# Altium schematic symbol library SCHLIB.SchLib: 2608 symbols (part 5 of 20) (continued)
## IC-AR0231AT
designator U?, comment AR0231AT
Image Sensor CMOS 1/2.7Inch 2.3MP 1928x1208Pixel 121-Pin IBGA Tray; Manufacturer Part Number: AR0231AT7B00XUEA0-DRBR; Manufacturer: ON Semiconductor; Supplier 1: Digi-Key; RoHS: No; Category: Optoelectronics; Pricing 1: 2700=31.06250 (USD); Supplier Part Number 1: AR0231AT7B00XUEA0-DRBR-ND
part A pins: A6 DATA0_P (out), A7 DATA1_N (out), A8 CLK_P (out), A9 DATA2_P (out), A10 DATA3_N (out), B2 DOUT0 (out), B3 DOUT1 (out), B4 EXTCLK (in), B6 DATA0_N (out), B7 DATA1_P (out), B8 CLK_N (out), B9 DATA2_N (out), B10 DATA3_P (out), C3 DOUT3 (out), C4 DOUT2 (out), C5 RESET_BAR# (in), D2 DOUT4 (out), D3 DOUT5 (out), E2 DOUT6 (out), E3 DOUT7 (out), F2 PIXCLK (out), F3 DOUT8 (out), G2 DOUT9 (out), G3 FRAME_VALID (out), G4 LINE_VALID (out), G8 ATEST1 (io), G9 ATEST2 (io), G10 ATEST3 (io), G11 ATEST4 (io), H2 DOUT11 (out), H3 DOUT10 (out), H8 SCLK (in), H9 SDATA (io), H10 TEMP_FLAG (out), J2 DOUT13 (out), J3 DOUT12 (out), J8 GPIO1 (io), J9 GPIO0 (io), J10 SYS_CHECK (out), K2 TEST (in), K7 SADDR2 (in), K8 SADDR1 (in), K9 SADDR0 (in), K10 GPIO3 (io), K11 GPIO2 (io)
part B pins: A2 DGND30 (power), B5 DGND3 (power), C2 AGND0 (power), C8 DGND28 (power), C10 DGND39 (power), D4 DGND21 (power), D5 DGND13 (power), D6 DGND5 (power), D7 DGND7 (power), D8 DGND38 (power), D9 AGND1 (power), E1 DGND0 (power), E4 DGND31 (power), E5 DGND23 (power), E6 DGND15 (power), E7 DGND17 (power), E8 DGND9 (power), E9 AGND2 (power), F4 DGND2 (power), F5 DGND33 (power), F6 DGND25 (power), F7 DGND27 (power), F8 DGND19 (power), F9 AGND3 (power), F11 AGND4 (power), G1 DGND10 (power), G5 DGND4 (power), G6 DGND35 (power), G7 DGND37 (power), H4 DGND12 (power), H5 DGND14 (power), H6 DGND6 (power), H7 DGND8 (power), J1 DGND20 (power), J4 DGND22 (power), J5 DGND24 (power), J6 DGND16 (power), J7 DGND18 (power), K3 DGND1 (power), K4 DGND32 (power), K5 DGND34 (power), K6 DGND26 (power), L3 DGND11 (power), L6 DGND36 (power), L9 DGND29 (power)
part C pins: A1 VDD_IO0 (power), A3 VDD1 (power), A4 VDD4 (power), A5 VDD_IO3 (power), A11 VDD_IO7 (power), B1 VDD0 (power), B11 VDD5 (power), C1 VAA0 (power), C6 VDD_SLVS (power), C7 VDD_PHY (power), C9 VDD_IO_PHY (power), C11 VPP (power), D1 VDD_IO2 (power), D10 VAA1 (power), D11 VAA_PIX (power), E10 VAA2 (power), E11 VAA4 (power), F1 VDD3 (power), F10 VAA3 (power), H1 VDD_IO4 (power), H11 VDD_IO8 (power), J11 VDD8 (power), K1 VDD6 (power), L1 VDD_IO6 (power), L2 VDD9 (power), L4 VDD_IO1 (power), L5 VDD7 (power), L7 VDD_IO5 (power), L8 VDD10 (power), L10 VDD2 (power), L11 VDD_IO9 (power)

## IC-AT24C128C-SSHM-B
designator U?, comment AT24C128C  Case/Package: SOIC8
IC EEPROM 128K I2C 1MHZ 8SOIC; Manufacturer: Microchip / Atmel; Manufacturer Part Number: AT24C128C-SSHM-B; Access Time: 900ns; Density: 128Kb; Interface: 2-Wire,I2C,Serial; Max Supply Voltage: 5.5V; Min Supply Voltage: 1.7V; Nominal Supply Current: 3mA; Number of Words: 16384; Washability: OK; Supplier 1: Digi-Key; Stock 1: 1826; Pricing 1: 1=0.45, 10=0.443, 25=0.4116, 100=0.3636 (USD); Mount: Surface Mount; Number of Pins: 8; Contact Plating: Matte,Tin; Min Operating Temperature: -40°C; Max Operating Temperature: 85°C; Max Frequency: 1MHz; Frequency: 1MHz; Packaging: Bulk; Package Quantity: 100; Memory Type: EEPROM; Memory Size: 128Kb; Length: 5.05mm; Height: 1.5mm; Width: 3.99mm; Radiation Hardening: No; REACH SVHC: No SVHC; ComponentLink1URL: https://www.verical.com/server-webapp/html/getDatasheet?partID=319282; ComponentLink1Description: https://www.verical.com/server-webapp/html/getDatasheet?partID=319282; ComponentLink2URL: http://www.microchip.com/mymicrochip/filehandler.aspx?ddocname=en589922; ComponentLink2Description: http://www.microchip.com/mymicrochip/filehandler.aspx?ddocname=en589922; ComponentLink3URL: http://www.farnell.com/datasheets/1726559.pdf; ComponentLink3Description: http://www.farnell.com/datasheets/1726559.pdf; Supplier Part Number 1: AT24C128C-SSHM-B-ND
footprint SOIC8
pins: 1 A0 (in), 2 A1 (in), 3 A2 (in), 4 GND (power), 5 SDA (io), 6 SCL (io), 7 WP, 8 VCC (power)

## IC-AZ1117
designator U?, comment AZ1117  (value not drawn)
IC REG LDO POSITIVE ADJ 0.8A SOT223; Manufacturer: Diodes; Manufacturer Part Number: AZ1117IH-3.3TRG1; Alternate PN: TLV1117IDCYR; Output Voltage: 3.3V; Output Current: 800mA; Dropout Voltage: 1.2V; Number of Regulators: 1; Min Current Limit: 1A; Washability: OK; RoHS: Yes; Mount: Surface Mount; Case/Package: TO-261-4; Number of Pins: 3; Min Operating Temperature: -40°C; Max Operating Temperature: 125°C; Packaging: Tape and Reel; ComponentLink1URL: https://www.diodes.com/assets/Datasheets/AZ1117I.pdf?src-supplier=Digi-Key; ComponentLink1Description: https://www.diodes.com/assets/Datasheets/AZ1117I.pdf?src-supplier=Digi-Key; Supplier 1: Digi-Key; Stock 1: 4737; Pricing 1: 1=0.62000, 10=0.54400, 100=0.41690, 500=0.32960, 1000=0.26368 (USD); Supplier Part Number 1: AZ1117IH-ADJTRG1DICT-ND
footprint SOT223 (SOT,2.30mm pitch;4 pin,3.50mm W X 6.50mm L X 1.70mm H body)
pins: 1 ADJ/GND (in), 2 VOUT (power), 3 VIN (power), 4 VOUT (power)
1 alternate drawing of the same symbol
text: POSITIVE; LDO

## IC-AZ1117CH-3.3TRG1
designator U?, comment AZ1117
IC REG LINEAR 3.3V 800MA SOT223; Manufacturer: Diodes; Manufacturer Part Number: AZ1117CH-3.3TRG1; Number of Regulators: 1; Dropout Voltage: 1.2V; Output Type: Fixed; Max Input Voltage: 15V; Accuracy: 1%; Min Current Limit: 1A; Quiescent Current: 6mA; Power Supply Rejection Ratio (PSRR): 70dB; Polarity: Positive; Max Output Current: 1.35A; Reference Voltage: 1.262V; Supplier 1: Digi-Key; Supplier Part Number 1: AZ1117CH-3.3TRG1DICT-ND; Stock: 32181; Pricing: 1=0.43, 10=0.322, 25=0.2816, 100=0.1608, 250=0.1508, 500=0.1206, 1000=0.0925 (USD); RoHS: Yes; Mount: Surface Mount; Case/Package: SOT-223; Number of Pins: 4; Min Operating Temperature: -20°C; Max Operating Temperature: 125°C; Output Current: 800mA; Packaging: Tape and Reel; Output Voltage: 3.3V; Number of Outputs: 1; Package Quantity: 4000; Length: 6.7mm; Height: 1.7mm; Width: 3.7mm; Lead Free: Lead Free; ComponentLink1URL: https://datasheet.ciiva.com/29569/az1117c-29569913.pdf?src-supplier=Digi-Key; ComponentLink1Description: https://datasheet.ciiva.com/29569/az1117c-29569913.pdf?src-supplier=Digi-Key; ComponentLink2URL: https://datasheet.ciiva.com/29569/az1117c-29569915.pdf?src-supplier=Digi-Key; ComponentLink2Description: https://datasheet.ciiva.com/29569/az1117c-29569915.pdf?src-supplier=Digi-Key; ComponentLink3URL: https://datasheet.ciiva.com/29569/az1117c-29569914.pdf?src-supplier=Digi-Key; ComponentLink3Description: https://datasheet.ciiva.com/29569/az1117c-29569914.pdf?src-supplier=Digi-Key
footprint SOT223 (SOT,2.30mm pitch;4 pin,3.50mm W X 6.50mm L X 1.70mm H body)
pins: 1 GND (in), 2 VOUT (power), 3 VIN (power), 4 VOUT (power)
text: LDO

## IC-BC846S
designator U?, comment Case/Package: 6TSSOP  (hidden comment: BC846S)
TRANS 2NPN 40V 0.1A 6TSSOP; Manufacturer: NXP Semiconductors; Max Power Dissipation: 200mW; Max Collector Current: 100mA; Collector Base Voltage (VCBO): 50V; Frequency: 100MHz; Polarity: NPN; Emitter Base Voltage (VEBO): 5V; Number of Elements: 2; Test Current: 5mA; Zener Voltage: 5.1V; Element Configuration: Dual; Current: 1A; Washability: OK; Supplier 1: Digi-Key; Stock 1: 0; RoHS: Yes; Mount: Surface Mount; Number of Pins: 6; Min Operating Temperature: -65°C; Max Operating Temperature: 150°C; Collector Emitter Voltage (VCEO): 40V; Package Quantity: 1; Packaging: Tape and Reel; Transition Frequency: 100MHz; Collector Emitter Breakdown Voltage: 40V; Max Breakdown Voltage: 40V; Power Dissipation: 200mW; Termination: SMD/SMT; Gain Bandwidth Product: 100MHz; Voltage: 40V; Radiation Hardening: No; REACH SVHC: No SVHC; Lead Free: Lead Free; ComponentLink1URL: https://datasheet.ciiva.com/4722/pumz1-104831-4722227.pdf?src-supplier=Mouser; ComponentLink1Description: https://datasheet.ciiva.com/4722/pumz1-104831-4722227.pdf?src-supplier=Mouser; ComponentLink2URL: https://datasheet.ciiva.com/6366/pumz1-6366963.pdf?src-supplier=Digi-Key; ComponentLink2Description: https://datasheet.ciiva.com/6366/pumz1-6366963.pdf?src-supplier=Digi-Key; ComponentLink3URL: https://datasheet.ciiva.com/968/pumz1-968100.pdf?src-supplier=Digi-Key; ComponentLink3Description: https://datasheet.ciiva.com/968/pumz1-968100.pdf?src-supplier=Digi-Key; ComponentLink4URL: https://datasheet.ciiva.com/6366/pumz1-6366965.pdf?src-supplier=Digi-Key; ComponentLink4Description: https://datasheet.ciiva.com/6366/pumz1-6366965.pdf?src-supplier=Digi-Key; ComponentLink5URL: https://datasheet.ciiva.com/1259/pimz2-pumz2-1259478.pdf?src-supplier=Newark; ComponentLink5Description: https://datasheet.ciiva.com/1259/pimz2-pumz2-1259478.pdf?src-supplier=Newark; ComponentLink6URL: https://datasheet.ciiva.com/11201/pumz1-11201527.pdf?src-supplier=Avnet; ComponentLink6Description: https://datasheet.ciiva.com/11201/pumz1-11201527.pdf?src-supplier=Avnet; ComponentLink7URL: https://datasheet.ciiva.com/16615/pumz1-16615180.pdf?src-supplier=Avnet+Europe; ComponentLink7Description: https://datasheet.ciiva.com/16615/pumz1-16615180.pdf?src-supplier=Avnet+Europe; Supplier Part Number 1: 568-6556-1-ND; Manufacturer Part Number: BC846S
footprint SOT-363
pins: 1, 2, 3, 4, 5, 6

## IC-BH76361FV-E2
designator U?, comment BH76361FV-E2
IC AMP MPLEX AMP 16SSOP; Manufacturer 1: Rohm; Number of Channels: 1; Nominal Supply Current: 10mA; Washability: OK; Supplier 1: Digi-Key; Manufacturer Part Number 1: BH76361FV-E2; Stock 1: 1651; Pricing 1: 1=3,22000, 10=2,89300, 25=2,73480, 100=2,37000, 250=2,24848, 500=2,01756, 1000=1,70156 (USD); RoHS: Yes; Mount: Surface Mount; Case/Package: LSSOP; Number of Pins: 16; Contact Plating: Copper,Tin; Min Operating Temperature: -40°C; Max Operating Temperature: 85°C; Packaging: Tape and Reel; Package Quantity: 2500; Number of Circuits: 1; Operating Supply Current: 10mA; Radiation Hardening: No; Lead Free: Lead Free; ComponentLink1URL: https://datasheet.ciiva.com/15120/getdatasheetpartid-457541-15120107.pdf?src-supplier=Verical; ComponentLink1Description: https://datasheet.ciiva.com/15120/getdatasheetpartid-457541-15120107.pdf?src-supplier=Verical; ComponentLink2URL: https://datasheet.ciiva.com/1823/bh76330fvm-e-1823882.pdf?src-supplier=Digi-Key; ComponentLink2Description: https://datasheet.ciiva.com/1823/bh76330fvm-e-1823882.pdf?src-supplier=Digi-Key; ComponentLink3URL: https://datasheet.ciiva.com/1823/bh76330fvm-e-1823883.pdf?src-supplier=Digi-Key; ComponentLink3Description: https://datasheet.ciiva.com/1823/bh76330fvm-e-1823883.pdf?src-supplier=Digi-Key; ComponentLink4URL: https://datasheet.ciiva.com/25921/bh76330fvm-e-25921499.pdf?src-supplier=Avnet+Europe; ComponentLink4Description: https://datasheet.ciiva.com/25921/bh76330fvm-e-25921499.pdf?src-supplier=Avnet+Europe; ComponentLink5URL: https://datasheet.ciiva.com/1823/bh76330fvm-e-1823884.pdf?src-supplier=Digi-Key; ComponentLink5Description: https://datasheet.ciiva.com/1823/bh76330fvm-e-1823884.pdf?src-supplier=Digi-Key; Supplier Part Number 1: BH76361FV-E2CT-ND
footprint SSOP16
pins: 1 PVCC (power), 2 IN1 (in), 3 VCC (power), 4 IN2 (in), 5 GND (power), 6 IN3 (in), 7 GND (power), 8 IN4 (in), 9 IN5 (in), 10 CTLA (in), 11 IN6 (in), 12 CTLB (in), 13 CTLC (in), 14 CTLD (in), 15 PGND (power), 16 OUT (out)
text: 6dB; 75R; L / O / G / I / C

## IC-BTS462-T
designator U?, comment BTS462-T
IC PWR SWITCH N-CHAN 1:1 TO252-5; Manufacturer: Infineon; Output Current: 3.5A; Number of Outputs: 1; Nominal Supply Current: 1.3mA; Max Supply Voltage: 34V; Max Power Dissipation: 41.6W; Min Input Voltage: 5V; On-State Resistance: 70mR; Output Current per Channel: 4.4A; Turn-On Delay Time: 170us; Turn-Off Delay Time: 230us; Voltage: 16V; Max Output Current: 14A; Supplier 1: Digi-Key; Supplier Part Number 1: BTS462TATMA1CT-ND; Manufacturer Part Number: BTS462-T; Stock: 6462; Pricing: 1=1.98, 10=1.776, 25=1.6756, 100=1.3406, 250=1.173, 500=1.1395, 1000=0.9049 (USD); RoHS: Yes; Case/Package: TO-252-5; Number of Pins: 5; Min Operating Temperature: -40°C; Max Operating Temperature: 150°C; Number of Channels: 1; Packaging: Tape and Reel; Power Dissipation: 41.6W; Package Quantity: 2500; Max Input Voltage: 34V; Min Supply Voltage: 5V; Max Supply Current: 1.3mA; Current: 4.4A; Operating Supply Voltage: 34V; Length: 6.5mm; Height: 2.3mm; Width: 6.22mm; Radiation Hardening: No; Halogen Free: Halogen Free; Lead Free: Contains Lead; REACH SVHC: No SVHC; ComponentLink1URL: https://datasheet.ciiva.com/15109/getdatasheetpartid-413054-15109087.pdf?src-supplier=Verical; ComponentLink1Description: https://datasheet.ciiva.com/15109/getdatasheetpartid-413054-15109087.pdf?src-supplier=Verical; ComponentLink2URL: https://datasheet.ciiva.com/1957/infineon-bts462t-ds-v01-01-en-1957175.pdf?src-supplier=Digi-Key; ComponentLink2Description: https://datasheet.ciiva.com/1957/infineon-bts462t-ds-v01-01-en-1957175.pdf?src-supplier=Digi-Key; ComponentLink3URL: https://datasheet.ciiva.com/1957/infineon-bts462t-ds-v01-01-en-1957176.pdf?src-supplier=Digi-Key; ComponentLink3Description: https://datasheet.ciiva.com/1957/infineon-bts462t-ds-v01-01-en-1957176.pdf?src-supplier=Digi-Key; ComponentLink4URL: https://datasheet.ciiva.com/1957/infineon-bts462t-ds-v01-01-en-1957177.pdf?src-supplier=Digi-Key; ComponentLink4Description: https://datasheet.ciiva.com/1957/infineon-bts462t-ds-v01-01-en-1957177.pdf?src-supplier=Digi-Key
footprint TO-252-5 (DPAK, 5-Leads, Body 6.5x6.12mm, Pitch 1.14mm, IPC Medium Density)
pins: 1 GND (power) "Logic ground.", 2 IN (in) "Input, activates the power switch in case of logical high signal.", 3 VBB (power) "Positive power supply voltage.", 4 NC "Not connected.", 5 OUT (power) "Output to the load."

## IC-BTS6143D
designator U?, comment BTS6143D
IC PWR SWITCH N-CHAN 1:1 TO252-5; Manufacturer: Infineon; Output Current: 8A; Number of Outputs: 1; Max Power Dissipation: 59W; Max Supply Voltage: 38V; Supplier 1: Digi-Key; Supplier Part Number 1: BTS6143DAUMA1CT-ND; Manufacturer Part Number: BTS6143D; Stock: 19929; Pricing: 1=2.56, 10=2.296, 25=2.1664, 100=1.7332, 250=1.5166, 500=1.4732, 1000=1.1699 (USD); RoHS: Yes; Mount: Surface Mount; Case/Package: TO-252; Min Operating Temperature: -40°C; Max Operating Temperature: 150°C; Packaging: Tape and Reel; Power Dissipation: 59W; Number of Channels: 1; Radiation Hardening: No; Lead Free: Contains Lead; Halogen Free: Halogen Free; ComponentLink1URL: https://datasheet.ciiva.com/26880/bts6143d-26880342.pdf?src-supplier=IIIC; ComponentLink1Description: https://datasheet.ciiva.com/26880/bts6143d-26880342.pdf?src-supplier=IIIC; ComponentLink2URL: https://datasheet.ciiva.com/1955/infineon-bts6143d-ds-v01-00-en-1955848.pdf?src-supplier=Digi-Key; ComponentLink2Description: https://datasheet.ciiva.com/1955/infineon-bts6143d-ds-v01-00-en-1955848.pdf?src-supplier=Digi-Key; ComponentLink3URL: https://datasheet.ciiva.com/1955/infineon-bts6143d-ds-v01-00-en-1955849.pdf?src-supplier=Digi-Key; ComponentLink3Description: https://datasheet.ciiva.com/1955/infineon-bts6143d-ds-v01-00-en-1955849.pdf?src-supplier=Digi-Key; ComponentLink4URL: https://datasheet.ciiva.com/1955/infineon-bts6143d-ds-v01-00-en-1955850.pdf?src-supplier=Digi-Key; ComponentLink4Description: https://datasheet.ciiva.com/1955/infineon-bts6143d-ds-v01-00-en-1955850.pdf?src-supplier=Digi-Key; ComponentLink5URL: https://datasheet.ciiva.com/26931/getdatasheetpartid-730772-26931260.pdf?src-supplier=Verical; ComponentLink5Description: https://datasheet.ciiva.com/26931/getdatasheetpartid-730772-26931260.pdf?src-supplier=Verical; ComponentLink6URL: https://datasheet.ciiva.com/41458/001183579-da-01-en-ic-switch-pwr-hisi-bts6143d-to-252-5-inf-41458534.pdf?src-supplier=Conrad; ComponentLink6Description: https://datasheet.ciiva.com/41458/001183579-da-01-en-ic-switch-pwr-hisi-bts6143d-to-252-5-inf-41458534.pdf?src-supplier=Conrad
footprint TO-252-5 (DPAK, 5-Leads, Body 6.5x6.12mm, Pitch 1.14mm, IPC Medium Density)
pins: 1 OUT_1 (power) "Output to the load.", 2 IN (in) "Input, activates the power switch in case of logical high signal.", 3 VBB (power) "Positive power supply voltage.", 4 IS "Not connected.", 5 OUT_2 (power) "Logic ground."

## IC-CAT24C128WI-GT3
designator U?, comment CAT24C128WI-GT3  Case/Package: SOIC8
IC EEPROM 128KBIT 400KHZ 8SOIC; Manufacturer: ON Semiconductor; Access Time: 900ns; Interface: 2-Wire,I2C,Serial; Density: 128Kb; Operating Supply Voltage: 5V; Max Supply Voltage: 5.5V; Min Supply Voltage: 1.8V; Nominal Supply Current: 3mA; Number of Words: 16000; Washability: OK; Supplier 1: Digi-Key; Manufacturer Part Number: CAT24C128WI-GT3; Stock 1: 2370; Pricing 1: 1=0.31, 10=0.309, 100=0.2532, 500=0.24616, 1000=0.23956 (USD); Mount: Surface Mount; Number of Pins: 8; Contact Plating: Gold; Min Operating Temperature: -40°C; Max Operating Temperature: 85°C; Packaging: Tape and Reel; Package Quantity: 1; Frequency: 400kHz; Memory Type: EEPROM; Memory Size: 128Kb; Max Frequency: 400kHz; Length: 0.196inch; Height: 1.5mm; Width: 0.157inch; Radiation Hardening: No; Lead Free: Lead Free; Halogen Free: Halogen Free; ComponentLink1URL: http://www.onsemi.com/pub_link/Collateral/CAT24C128-D.PDF; ComponentLink1Description: http://www.onsemi.com/pub_link/Collateral/CAT24C128-D.PDF; ComponentLink2URL: http://www.onsemi.com/pub/Collateral/CAT24C128-D.PDF; ComponentLink2Description: http://www.onsemi.com/pub/Collateral/CAT24C128-D.PDF; ComponentLink3URL: https://www.verical.com/server-webapp/html/getDatasheet?partID=316844; ComponentLink3Description: https://www.verical.com/server-webapp/html/getDatasheet?partID=316844; Supplier Part Number 1: CAT24C128WI-GT3DKR-ND
footprint SOIC8
pins: 1 A0 (in), 2 A1 (in), 3 A2 (in), 4 GND (power), 5 SDA (io), 6 SCL (io), 7 WP, 8 VCC (power)

## IC-CD22M3494MQZ
designator U?, comment CD22M3494MQZ
IC CROSSPOINT SWITCH 16X8 44PLCC; Manufacturer: Intersil; Min Supply Voltage: 4V; Max Supply Voltage: 15V; Operating Supply Voltage: 12V; On-State Resistance: 65R; Operating Supply Current: 5mA; Supply Type: Single; Washability: OK; Supplier 1: Digi-Key; Supplier Part Number 1: CD22M3494MQZ-ND; Manufacturer Part Number: CD22M3494MQZ; Stock: 1291; Pricing: 1=7.28, 10=6.579, 25=6.2732, 100=5.202, 250=4.743, 500=4.437, 1000=3.978, 2500=3.825, 5000=3.7638 (USD); RoHS: Yes; Mount: Surface Mount; Case/Package: PLCC; Number of Pins: 44; Min Operating Temperature: -40°C; Max Operating Temperature: 85°C; Package Quantity: 26; Packaging: Rail/Tube; REACH SVHC: No SVHC; Lead Free: Lead Free; ComponentLink1URL: https://datasheet.ciiva.com/16633/fn2793-16633684.pdf?src-supplier=Avnet+Europe; ComponentLink1Description: https://datasheet.ciiva.com/16633/fn2793-16633684.pdf?src-supplier=Avnet+Europe; ComponentLink2URL: https://datasheet.ciiva.com/26824/cd22m3494mqz-26824877.pdf?src-supplier=IIIC; ComponentLink2Description: https://datasheet.ciiva.com/26824/cd22m3494mqz-26824877.pdf?src-supplier=IIIC; ComponentLink3URL: https://datasheet.ciiva.com/1514/fn2793-1514669.pdf?src-supplier=Element14; ComponentLink3Description: https://datasheet.ciiva.com/1514/fn2793-1514669.pdf?src-supplier=Element14; ComponentLink4URL: https://datasheet.ciiva.com/6638/fn2793-6638251.pdf?src-supplier=Digi-Key; ComponentLink4Description: https://datasheet.ciiva.com/6638/fn2793-6638251.pdf?src-supplier=Digi-Key
footprint PLCC44 (Leaded Chip Carrier, 44-Leads, Body 16.6x16.6mm, Pitch 1.27mm, IPC Low Density)
pins: 1 Y3, 2 AY2, 3 RESET, 4 AX3, 5 AX0, 7 X14, 8 X15, 9 X6, 10 X7, 11 X8, 12 X9, 13 X10, 14 X11, 17 Y7, 18 VSS, 19 Y6, 20 STROBE, 21 Y5, 22 VEE, 23 Y4, 24 AX1, 25 AX2, 26 AY0, 27 AY1, 30 X13, 31 X12, 32 X5, 33 X4, 34 X3, 35 X2, 36 X1, 37 X0, 39 Y0, 40 CS, 41 Y1, 42 DATA, 43 Y2, 44 VDD

## IC-CD74HC238PWR
designator U?, comment CD74HC238PWR
IC DECODER/DEMUX HS 3-8 16-TSSOP; Manufacturer: Texas Instruments; Number of Inputs: 3; Number of Outputs: 8; Propagation Delay: 265ns; Max Supply Voltage: 6V; Min Supply Voltage: 2V; Logic Function: Demultiplexer,Decoder; Number of Elements: 1; Rise Time: 400ns; High Level Output Current: -5.2mA; Low Level Output Current: 5.2mA; Polarity: Non-Inverting; Quiescent Current: 8uA; Supply Type: Single; Bandwidth: 28MHz; Output Current: 25mA; Washability: OK; Supplier 1: Digi-Key; Supplier Part Number 1: 296-13814-1-ND; Manufacturer Part Number: CD74HC238PWR; Stock 1: 88860; Pricing 1: 1=0.49000, 10=0.42100, 25=0.39280, 100=0.31440, 250=0.29192, 500=0.24700, 1000=0.19086 (USD); RoHS: Yes; Mount: Surface Mount; Case/Package: TSSOP; Number of Pins: 16; Weight: 0.002183oz; Contact Plating: Gold; Min Operating Temperature: -55°C; Max Operating Temperature: 125°C; Packaging: Tape and Reel; Package Quantity: 2000; Number of Input Lines: 3; Number of Output Lines: 8; Turn-On Delay Time: 265ns; Termination: SMD/SMT; Number of Circuits: 1; Number of Bits: 8; Independent Circuits: 1; Number of Channels: 1; Max Frequency: 28MHz; Output Voltage: 6V; Max Supply Current: 8uA; Length: 5mm; Height: 1.15mm; Width: 4.4mm; Radiation Hardening: No; REACH SVHC: No SVHC; Lead Free: Lead Free; ComponentLink1URL: https://datasheet.ciiva.com/1888/cd74hc138-1888752.pdf?src-supplier=Digi-Key; ComponentLink1Description: https://datasheet.ciiva.com/1888/cd74hc138-1888752.pdf?src-supplier=Digi-Key; ComponentLink2URL: https://datasheet.ciiva.com/15092/getdatasheetpartid-310028-15092428.pdf?src-supplier=Verical; ComponentLink2Description: https://datasheet.ciiva.com/15092/getdatasheetpartid-310028-15092428.pdf?src-supplier=Verical; ComponentLink3URL: https://datasheet.ciiva.com/1888/cd74hc138-1888754.pdf?src-supplier=Digi-Key; ComponentLink3Description: https://datasheet.ciiva.com/1888/cd74hc138-1888754.pdf?src-supplier=Digi-Key; ComponentLink4URL: https://datasheet.ciiva.com/14293/cd54hc238-14293194.pdf?src-supplier=Avnet; ComponentLink4Description: https://datasheet.ciiva.com/14293/cd54hc238-14293194.pdf?src-supplier=Avnet; ComponentLink5URL: https://datasheet.ciiva.com/14294/cd54hc238-14294925.pdf?src-supplier=Avnet; ComponentLink5Description: https://datasheet.ciiva.com/14294/cd54hc238-14294925.pdf?src-supplier=Avnet; ComponentLink6URL: https://datasheet.ciiva.com/1888/cd74hc138-1888753.pdf?src-supplier=Digi-Key; ComponentLink6Description: https://datasheet.ciiva.com/1888/cd74hc138-1888753.pdf?src-supplier=Digi-Key; ComponentLink7URL: https://datasheet.ciiva.com/22645/1861095-22645579.pdf?src-supplier=Element14; ComponentLink7Description: https://datasheet.ciiva.com/22645/1861095-22645579.pdf?src-supplier=Element14; ComponentLink8URL: https://datasheet.ciiva.com/22654/1762451-22654207.pdf?src-supplier=Farnell; ComponentLink8Description: https://datasheet.ciiva.com/22654/1762451-22654207.pdf?src-supplier=Farnell
footprint TSSOP16
pins: 1 A0 (in), 2 A1 (in), 3 A2 (in), 4 ~{E1} (in), 5 ~{E2} (in), 6 E3 (in), 7 Y7 (out), 8 GND (power), 9 Y6 (out), 10 Y5 (out), 11 Y4 (out), 12 Y3 (out), 13 Y2 (out), 14 Y1 (out), 15 Y0 (out), 16 VCC (power)

## IC-CD4011BNSR
designator U?, comment CD4011BNSR  Case/Package: SOIC14
IC GATE NAND 4CH 2-INP 14-SO; Manufacturer: Texas Instruments; Number of Outputs: 1; Max Supply Voltage: 18V; Min Supply Voltage: 3V; Propagation Delay: 90ns; Number of Inputs: 2; Number of Circuits: 4; Quiescent Current: 1uA; High Level Output Current: 3.4mA; Turn-On Delay Time: 250ns; Output Current: 6.8mA; Washability: OK; Supplier 1: Digi-Key; Manufacturer Part Number: CD4011BNSR; Stock 1: 2973; Pricing 1: 1=0.46, 10=0.398, 100=0.2971, 500=0.2334, 1000=0.18035 (USD); Mount: Surface Mount; Number of Pins: 14; Weight: 0.007348oz; Contact Plating: Gold; Min Operating Temperature: -55°C; Max Operating Temperature: 125°C; Packaging: Tape and Reel; Package Quantity: 1; Logic Function: NAND; Low Level Output Current: 3.4mA; Number of Gates: 4; Number of Input Lines: 2; Number of Output Lines: 1; Number of Elements: 4; Number of Bits: 4; Lead Free: Lead Free; ComponentLink1URL: http://www.ti.com/lit/pdf/sdyu001; ComponentLink1Description: http://www.ti.com/lit/pdf/sdyu001; ComponentLink2URL: http://www.ti.com/general/docs/lit/getliterature.tsp?genericPartNumber=CD4011B-MIL&&fileType=pdf; ComponentLink2Description: http://www.ti.com/general/docs/lit/getliterature.tsp?genericPartNumber=CD4011B-MIL&&fileType=pdf; Supplier Part Number 1: 296-14085-6-ND
footprint SOIC14
pins: 1 1A, 2 1B, 3 1Y, 4 2Y, 5 2A, 6 2B, 7 GND, 8 3A, 9 3B, 10 3Y, 11 4Y, 12 4A, 13 4B, 14 VCC

## IC-CD4013BM96G4
designator U?, comment CD4013B
IC FF D-TYPE DUAL 1BIT 14SOIC; Manufacturer: Texas Instruments; Manufacturer Part Number: CD4013BM96G4; Polarity: Non-Inverting; Frequency: 24MHz; Logic Function: AND,D-Type; Max Supply Voltage: 18V; Min Supply Voltage: 3V; Number of Bits: 2; Propagation Delay: 300ns; Clock Edge Trigger Type: Positive Edge; Turn-On Delay Time: 45ns; High Level Output Current: -4.2mA; Low Level Output Current: 6.8mA; Number of Bits per Element: 1; Number of Outputs: 4; Quiescent Current: 20uA; Washability: OK; Supplier 1: Digi-Key; Supplier Part Number 1: 296-31487-1-ND; Stock: 8095; Pricing: 1=0.41, 10=0.353, 25=0.3292, 100=0.2632, 250=0.2444, 500=0.2068, 1000=0.1598 (USD); RoHS: Yes; Mount: Surface Mount; Case/Package: SOIC; Number of Pins: 14; Weight: 0.004564oz; Contact Plating: Gold; Min Operating Temperature: -55°C; Max Operating Temperature: 125°C; Packaging: Tape and Reel; Number of Elements: 2; Number of Circuits: 2; Package Quantity: 2500; Number of Input Lines: 1; Number of Output Lines: 1; Length: 8.65mm; Height: 1.58mm; Width: 3.91mm; Radiation Hardening: No; Lead Free: Lead Free; ComponentLink1URL: https://datasheet.ciiva.com/26054/cd4013b-mil-26054901.pdf?src-supplier=Avnet+Europe; ComponentLink1Description: https://datasheet.ciiva.com/26054/cd4013b-mil-26054901.pdf?src-supplier=Avnet+Europe
footprint SOIC14
pins: 1 Q1 (out), 2 Q1 (out), 3 CLOCK1 (in), 4 RESET1 (in), 5 D1 (in), 6 SET1 (in), 7 VSS (power), 8 SET2 (in), 9 D2 (in), 10 RESET2 (in), 11 CLOCK2 (in), 12 Q2 (out), 13 Q2 (out), 14 VDD (power)

## IC-CD4066BM96
designator U?, comment CD4066BM96  Case/Package: SOIC14
IC QUAD BILATERAL SWITCH 14-SOIC; Manufacturer: Texas Instruments; Number of Inputs: 4; Min Supply Voltage: 3V; Max Supply Voltage: 18V; Supply Type: Dual,Single; Min Dual Supply Voltage: 1.5V; Max Dual Supply Voltage: 9V; Bandwidth: 40MHz; Dual Supply Voltage: 7.5V; On-State Resistance: 240R; Turn-On Delay Time: 30ns; Max Supply Current: 5uA; Polarity: Non-Inverting; Throw Configuration: SPST; Quiescent Current: 20nA; Washability: OK; Supplier 1: Digi-Key; Manufacturer Part Number: CD4066BM96; Stock 1: 71359; Pricing 1: 1=0.42, 10=0.363, 100=0.2711, 500=0.213, 1000=0.16459 (USD); Mount: Surface Mount; Number of Pins: 14; Weight: 0.004318oz; Contact Plating: Gold; Min Operating Temperature: -55°C; Max Operating Temperature: 125°C; Number of Outputs: 4; Packaging: Tape and Reel; Package Quantity: 2500; Independent Circuits: 4; Number of Channels: 4; Turn-Off Delay Time: 30ns; Number of Bits: 4; Length: 8.65mm; Height: 1.58mm; Width: 3.91mm; Radiation Hardening: No; Lead Free: Lead Free; REACH SVHC: No SVHC; ComponentLink1URL: http://www.farnell.com/datasheets/1874823.pdf; ComponentLink1Description: http://www.farnell.com/datasheets/1874823.pdf; ComponentLink2URL: http://www.ti.com/lit/ds/symlink/cd4066b.pdf; ComponentLink2Description: http://www.ti.com/lit/ds/symlink/cd4066b.pdf; ComponentLink3URL: http://www.ti.com/general/docs/lit/getliterature.tsp?genericPartNumber=CD4066B-MIL&&fileType=pdf; ComponentLink3Description: http://www.ti.com/general/docs/lit/getliterature.tsp?genericPartNumber=CD4066B-MIL&&fileType=pdf; ComponentLink4URL: https://www.verical.com/server-webapp/html/getDatasheet?partID=50227; ComponentLink4Description: https://www.verical.com/server-webapp/html/getDatasheet?partID=50227; ComponentLink5URL: http://focus.ti.com/lit/ds/symlink/cd4066b.pdf; ComponentLink5Description: http://focus.ti.com/lit/ds/symlink/cd4066b.pdf; Supplier Part Number 1: 296-14475-6-ND
footprint SOIC14
pins: 1 SIGA-IN/OUT, 2 SIGA-OUT/IN, 3 SIGB-OUT/IN, 4 SIGB-IN/OUT, 5 CONTROLB, 6 CONTROLC, 7 GND, 8 SIGC-IN/OUT, 9 SIGC-OUT/IN, 10 SIGD-OUT/IN, 11 SIGD-/IN/OUT, 12 CONTROLD, 13 CONTROLA, 14 VCC

## IC-CD4067BM96G4
designator U?, comment CD4067BM96G4  Case/Package: SOIC24
IC MUX/DEMUX 1X16 24SOIC; Manufacturer: Texas Instruments; Bandwidth: 14MHz; Min Supply Voltage: 3V; Max Supply Voltage: 18V; On-State Resistance: 240R; Turn-On Delay Time: 650ns; Turn-Off Delay Time: 440ns; Supply Type: Single; Nominal Supply Current: 100uA; Propagation Delay: 60ns; Max Power Dissipation: 500mW; Number of Inputs: 16; Number of Outputs: 1; Operating Supply Current: 80nA; Logic Function: Multiplexer,Demultiplexer; Washability: OK; Supplier 1: Digi-Key; Manufacturer Part Number: CD4067BM96G4; Stock 1: 0; Pricing 1: 2000=0,52269 (USD); RoHS: Yes; Mount: Surface Mount; Number of Pins: 24; Weight: 0.02187oz; Contact Plating: Gold; Min Operating Temperature: -55°C; Max Operating Temperature: 125°C; Packaging: Tape and Reel; Package Quantity: 2000; Number of Channels: 1; Power Dissipation: 500mW; Number of Bits: 16; Lead Free: Lead Free; ComponentLink1URL: https://datasheet.ciiva.com/1682/cd4067b-1682287.pdf?src-supplier=Digi-Key; ComponentLink1Description: https://datasheet.ciiva.com/1682/cd4067b-1682287.pdf?src-supplier=Digi-Key; Supplier Part Number 1: CD4067BM96G4-ND
footprint SOIC24
pins: 1 OUT, 2 S7, 3 S6, 4 S5, 5 S4, 6 S3, 7 S2, 8 S1, 9 S0, 10 A, 11 B, 12 GND, 13 D, 14 C, 15 INH, 16 S15, 17 S14, 18 S13, 19 S12, 20 S11, 21 S10, 22 S9, 23 S8, 24 VCC

## IC-CPC1117NTR
designator U?, comment CPC1117NTR  Case/Package: SOP4
SSR RELAY SPST-NC 150MA 0-60V; Manufacturer: Ixys Clare; Output Voltage: 60V; Throw Configuration: SPST; On-State Resistance: 16R; Isolation Voltage: 1.5kV; Max Input Current: 50mA; Voltage Rating: 50V; Contact Resistance: 20mR; Max Voltage Rating (DC): 5.05kV; Current Rating: 1A; Number of Positions: 5; Gender: Male; Connector Type: Male Pin; Pitch: 1mm; Glow Wire Compliant: Non-compliant; Washability: OK; Supplier 1: Future Electronics; Manufacturer Part Number: CPC1117NTR; Stock 1: 93488; Pricing 1: 1=2,60000, 100=1,95000, 250=1,84000, 500=1,77000, 1000=1,69000 (USD); RoHS: Yes; Mount: Surface Mount; Number of Pins: 4; Min Operating Temperature: -40°C; Max Operating Temperature: 85°C; Packaging: Tape and Reel; Max Output Current: 150mA; Package Quantity: 2000; Output Current: 150mA; Termination: Gull Wing; Load Current: 150mA; Max Output Voltage: 60V; Input Current: 50mA; Relay Type: Relay; Length: 4.089mm; Height: 2.184mm; Width: 3.8mm; Radiation Hardening: No; ComponentLink1URL: https://datasheet.ciiva.com/16498/cpc1117ntr-16498380.pdf?src-supplier=Future+Electronics; ComponentLink1Description: https://datasheet.ciiva.com/16498/cpc1117ntr-16498380.pdf?src-supplier=Future+Electronics; ComponentLink2URL: https://datasheet.ciiva.com/2421/cpc1117n-2421253.pdf?src-supplier=Digi-Key; ComponentLink2Description: https://datasheet.ciiva.com/2421/cpc1117n-2421253.pdf?src-supplier=Digi-Key; ComponentLink3URL: https://datasheet.ciiva.com/2421/cpc1117n-2421254.pdf?src-supplier=Digi-Key; ComponentLink3Description: https://datasheet.ciiva.com/2421/cpc1117n-2421254.pdf?src-supplier=Digi-Key; ComponentLink4URL: https://datasheet.ciiva.com/2421/cpc1117n-2421255.pdf?src-supplier=Digi-Key; ComponentLink4Description: https://datasheet.ciiva.com/2421/cpc1117n-2421255.pdf?src-supplier=Digi-Key; ComponentLink5URL: https://datasheet.ciiva.com/39122/3cpc1117n-39122778.pdf?src-supplier=Onlinecomponents.com; ComponentLink5Description: https://datasheet.ciiva.com/39122/3cpc1117n-39122778.pdf?src-supplier=Onlinecomponents.com; Supplier Part Number 1: CPC1117NTR-CUTT; Color: Natural; Contact Plating: Tin; Contact Material: Bronze,Tin; Housing Color: Natural; Housing Material: Nylon; Number of Rows: 1; Voltage Rating (AC): 50V; Fastening Type: Detent; Number of Contacts: 5; Max Voltage Rating (AC): 50V; Contact Gender: Male; Orientation: Vertical; Number of Circuits: 5; Depth: 3.6mm; REACH SVHC: Unknown; Lead Free: Lead Free; ComponentLink6URL: https://datasheet.ciiva.com/11748/0900766b80b0af91-11748006.pdf?src-supplier=RSComponents; ComponentLink6Description: https://datasheet.ciiva.com/11748/0900766b80b0af91-11748006.pdf?src-supplier=RSComponents; ComponentLink7URL: https://datasheet.ciiva.com/30169/101445013310507-pcb-headers-30169975.pdf?src-supplier=Onlinecomponents.com; ComponentLink7Description: https://datasheet.ciiva.com/30169/101445013310507-pcb-headers-30169975.pdf?src-supplier=Onlinecomponents.com; ComponentLink8URL: https://datasheet.ciiva.com/9469/5013310507-pcb-headers-9469065.pdf?src-supplier=Avnet; ComponentLink8Description: https://datasheet.ciiva.com/9469/5013310507-pcb-headers-9469065.pdf?src-supplier=Avnet; ComponentLink9URL: https://datasheet.ciiva.com/5156/5013310507-pcb-headers-179252-5156221.pdf?src-supplier=Mouser; ComponentLink9Description: https://datasheet.ciiva.com/5156/5013310507-pcb-headers-179252-5156221.pdf?src-supplier=Mouser; ComponentLink10URL: https://datasheet.ciiva.com/7683/1631871-7683719.pdf?src-supplier=Element14; ComponentLink10Description: https://datasheet.ciiva.com/7683/1631871-7683719.pdf?src-supplier=Element14
footprint SOP_4
pins: 1 A (in), 2 K (out), 3 OUT_AC2 (io), 4 OUT_AC1 (io)

## IC-CPC2017NTR
designator U?, comment CPC2017
RELAY SSR OPTOMOS DUAL NO 8-SOIC; Manufacturer: Ixys Clare; Manufacturer Part Number: CPC2017NTR; Output Current: 120mA; On-State Resistance: 16R; Max Output Voltage: 60V; Isolation Voltage: 1.5kV; Throw Configuration: DPST; Input Current: 50mA; Washability: OK; Supplier 1: Digi-Key; Supplier Part Number 1: 212-CPC2017NCT-ND; Stock 1: 1521; Pricing 1: 1=1.48000, 10=1.38600, 25=1.23200, 50=1.17040, 100=1.10880, 250=0.98560, 500=0.92400, 1000=0.86240 (USD); RoHS: Yes; Mount: Surface Mount; Case/Package: SOP; Min Operating Temperature: -40°C; Max Operating Temperature: 85°C; Package Quantity: 2000; Packaging: Tape and Reel; Load Current: 120mA; Termination: Gull Wing; Relay Type: Relay; Radiation Hardening: No; Lead Free: Lead Free; ComponentLink1URL: http://components.arrow.com/part/dataview/57219127S8988520N2018?src-supplier=Arrow; ComponentLink1Description: http://components.arrow.com/part/dataview/57219127S8988520N2018?src-supplier=Arrow; ComponentLink2URL: http://www.mouser.com/ds/2/205/CPC2017N-275017.pdf?src-supplier=Mouser; ComponentLink2Description: http://www.mouser.com/ds/2/205/CPC2017N-275017.pdf?src-supplier=Mouser; ComponentLink3URL: http://www.ixysic.com/home/pdfs.nsf/www/CPC2017N.pdf/file/CPC2017N.pdf?src-supplier=Digi-Key; ComponentLink3Description: http://www.ixysic.com/home/pdfs.nsf/www/CPC2017N.pdf/file/CPC2017N.pdf?src-supplier=Digi-Key
footprint 8-SOP 2.54mm Pitch (8-SOP (0.150", 3.81mm Width))
pins: 1, 2, 3, 4, 5, 6, 7, 8

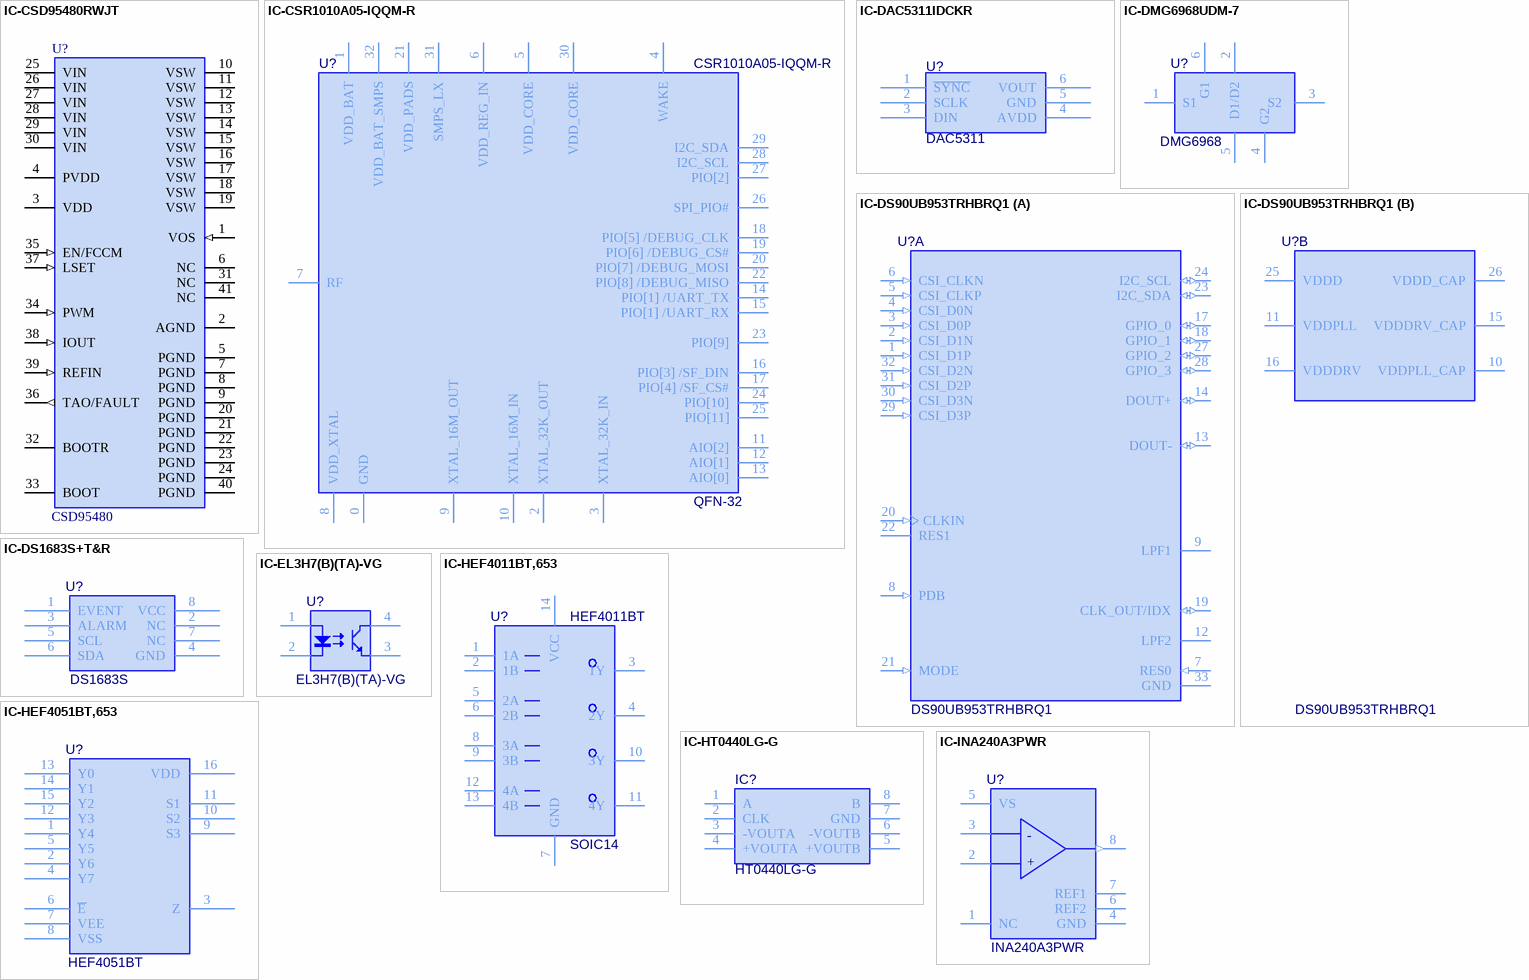
[diagram p18: symbols IC-CSD95480RWJT to IC-INA240A3PWR]
